# Altium footprint library Blue Tractor-2021.PcbLib: 82 footprints (part 4 of 6)
Each footprint in its own frame and in the unit in brackets; x right, y up, seen from the top. Pads: shape width x height; smd on the part's side, far side on the other; paste and mask are expansions set on the pad; w line width, h text height; cw(c..) or ccw(c..) is an arc to the next point about the centre after c.
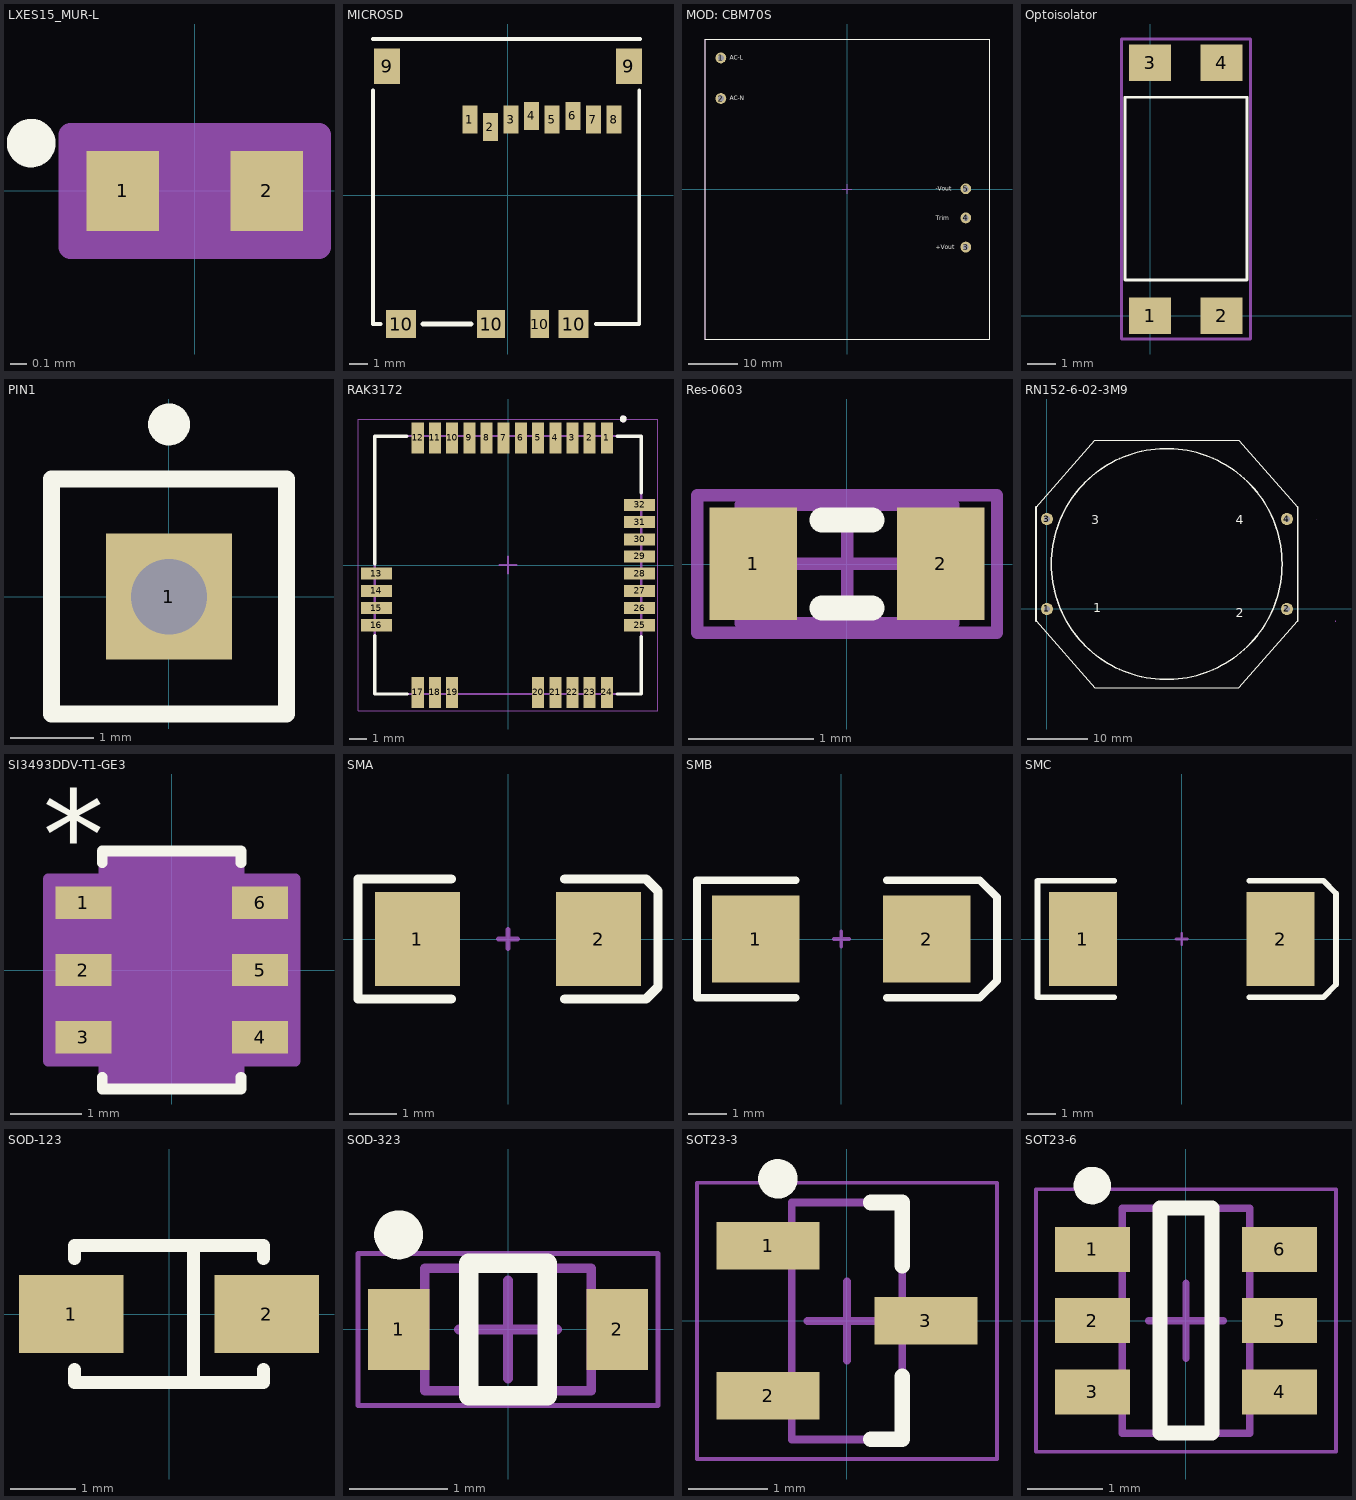
[diagram p3: the footprints below, top view; thin cyan lines are the x and y axes]

## LXES15_MUR-L [mm] "TVS"
pads (2):
  rect 0.452x0.499 smd paste+0 mask+0: 1(-0.451,0) 2(0.451,0)
Top Overlay:
  circle w0.152: c-1.025,0.3 r0.076
Mechanical 13:
  circle w0: c-0.324,0 r0.076
  lines w0.025: -0.525,-0.275 -0.525,0.275 ; -0.525,-0.275 0.525,-0.275 ; -0.525,-0.275 -0.225,-0.275 -0.225,0.275 -0.525,0.275 ; -0.525,-0.275 -0.525,0.275 ; -0.525,0.275 0.525,0.275 ; 0.525,-0.275 0.525,0.275 ; 0.525,-0.275 0.525,0.275 ; 0.525,-0.275 0.225,-0.275 0.225,0.275 0.525,0.275
Mechanical 15:
  region: 0.779,-0.351 -0.779,-0.351 -0.779,0.351 0.779,0.351
  lines w0.152: -0.779,-0.351 0.779,-0.351 0.779,0.351 -0.779,0.351 -0.779,-0.351
3D body "LXES15_MUR.step": height 0.33, standoff 0, extent -0.525,-0.275 0.525,0.275

## MICROSD [mm]
height 1.8
pads (14):
  rect 0.8x1.5 smd: 1(-2.04,4.025) 2(-0.94,3.625) 3(0.16,4.025) 4(1.26,4.225) 5(2.36,4.025) 6(3.46,4.225) 7(4.56,4.025) 8(5.66,4.025)
  rect 1.4x1.9 smd: 9(-6.45,6.875) 9(6.45,6.875)
  rect 1.6x1.5 smd: 10(-5.7,-6.875) 10(3.5,-6.875)
  rect 1.5x1.5 smd: 10(-0.9,-6.875)
  rect 1x1.5 smd: 10(1.7,-6.875)
Top Overlay:
  lines w0.2: -7.2,5.575 -7.2,-6.875 -6.8,-6.875 ; -7.2,8.325 7.05,8.325 ; 4.675,-6.875 7,-6.875 7,5.575
  lines w0.254: -4.55,-6.875 -1.975,-6.875
3D body "User Library-MEM2050.step": height 1.9, standoff 0, extent -7.2,-6.875 7.05,8.325

## MOD: CBM70S [mm] "AC/DC CONVERTER"
height 17
pads (5):
  round 2.2 hole 1.2: 1(-25.65,26.66) 2(-25.65,18.4) 3(24.15,-11.8) 4(24.15,-5.88) 5(24.15,0.04)
Top Overlay:
  lines w0.2: -28.9,-30.5 -28.9,30.5 28.9,30.5 28.9,-30.5 -28.9,-30.5
  text "+Vout" at 18,-12.24 h0.9
  text "Trim" at 18,-6.32 h0.9
  text "-Vout" at 18,-0.4 h0.9
  text "AC-N" at -23.8,18.04 h0.9
  text "AC-L" at -23.8,26.3 h0.9
Mechanical 13:
  lines w0.1: -28.9,-30.5 28.9,-30.5 28.9,30.5 -28.9,30.5 -28.9,-30.5
Mechanical 15:
  lines w0.1: -1,0 1,0 ; 0,-1 0,1 ; -28.9,-30.5 28.9,-30.5 28.9,30.5 -28.9,30.5 -28.9,-30.5
3D body "User Library-CBM70S.STEP": height 17, standoff -6.6, extent -28.95,-30.5 28.95,30.5

## Optoisolator [mm] "TV-817S"
pads (4):
  rect 1.5x1.3 smd: 1(0,0) 2(2.54,0) 3(0,9) 4(2.54,9)
Top Overlay:
  lines w0.1: 3.425,1.275 -0.9,1.275 -0.9,7.775 3.45,7.775 3.45,1.275
Mechanical 15:
  lines w0.1: -1.025,-0.825 -1.025,9.85 3.575,9.85 3.575,-0.825 -1.025,-0.825

## PIN1 [mm] "Connector; Plug"
pads (1):
  rect 1.5x1.5 hole 0.9: 1(0,0)
Top Overlay:
  circle w0.25: c0,2.05 r0.125
  lines w0.2: -1.4,-1.4 -1.4,1.4 1.4,1.4 1.4,-1.4 -1.4,-1.4

## RAK3172 [mm] "SMD RF MODULE"
height 3.5
pads (32):
  rect 0.7x1.8 smd: 1(5.75,7.4) 2(4.75,7.4) 3(3.75,7.4) 4(2.75,7.4) 5(1.75,7.4) 6(0.75,7.4) 7(-0.25,7.4) 8(-1.25,7.4) 9(-2.25,7.4) 10(-3.25,7.4) 11(-4.25,7.4) 12(-5.25,7.4) 17(-5.25,-7.4) 18(-4.25,-7.4) 19(-3.25,-7.4) 20(1.75,-7.4) 21(2.75,-7.4) 22(3.75,-7.4) 23(4.75,-7.4) 24(5.75,-7.4)
  rect 1.8x0.7 smd: 13(-7.65,-0.5) 14(-7.65,-1.5) 15(-7.65,-2.5) 16(-7.65,-3.5) 25(7.65,-3.5) 26(7.65,-2.5) 27(7.65,-1.5) 28(7.65,-0.5) 29(7.65,0.5) 30(7.65,1.5) 31(7.65,2.5) 32(7.65,3.5)
Top Overlay:
  circle w0.2: c6.7,8.5 r0.1
  lines w0.2: -7.75,-4.1 -7.75,-7.5 -5.85,-7.5 ; -7.75,0.075 -7.75,7.5 -5.9,7.5 ; 6.35,-7.5 7.75,-7.5 7.75,-4.175 ; 6.35,7.5 7.75,7.5 7.75,4.2
Mechanical 13:
  circle w0.2: c6.7,8.5 r0.1
  lines w0.127: -7.75,-7.5 7.75,-7.5 7.75,7.5 -7.75,7.5 -7.75,-7.5
Mechanical 15:
  lines w0.05: -8.725,-8.475 8.725,-8.475 8.725,8.475 -8.725,8.475 -8.725,-8.475
  lines w0.1: -0.5,0 0.5,0 ; 0,-0.5 0,0.5
3D body "3D_RAK3172.stp": height 3.5, standoff -0.01, extent -7.75,-7.5 7.75,7.5

## Res-0603 [mm] "Chip Resistor, Body 1.6x0.8mm, IPC High Density"
height 0.9
pads (2):
  rect 0.7x0.9 smd: 1(-0.75,0) 2(0.75,0)
Top Overlay:
  lines w0.2: -0.2,-0.35 0.2,-0.35 ; -0.2,0.35 0.2,0.35
Mechanical 13:
  lines w0.1: -0.85,-0.475 -0.85,0.475 0.85,0.475 0.85,-0.475 -0.85,-0.475
Mechanical 15:
  lines w0.1: -0.475,0 0.475,0 ; 0,-0.475 0,0.475 ; -1.2,-0.55 -1.2,0.55 1.2,0.55 1.2,-0.55 -1.2,-0.55
3D body "User Library-Panasonic0603.step": height 0.45, standoff 0, extent -0.8,-0.41 0.8,0.41

## RN152-6-02-3M9 [mm] "INDUCTOR SINF"
pads (4):
  round 2 hole 1: 1(0,0) 2(40,0) 3(0,15) 4(40,15)
Top Overlay:
  circle w0.254: c19.95,7.5 r19.235
  lines w0.2: -1.825,-2 8,-13.1 32,-13.1 41.825,-2 ; -1.825,17 8,28.1 32,28.1 41.825,17
  lines w0.254: -1.825,-2 -1.825,17 ; 41.825,-2 41.825,17
  text "1" at 7.675,-0.525 h1.52
  text "2" at 31.475,-1.35 h1.52
  text "3" at 7.35,14.1 h1.52
  text "4" at 31.475,14.1 h1.52
Mechanical 11:
  lines w0.1: 44.85,14.925 44.85,15 ; 48.175,-2.1 48.175,-1.95

## SI3493DDV-T1-GE3 [mil] "N Channel transistor 6TSOP_VIS-L"
pads (6):
  rect 31x18 smd paste+0 mask+0: 1(-49,37.4) 2(-49,0) 3(-49,-37.4) 4(49,-37.4) 5(49,0) 6(49,37.4)
Top Overlay:
  lines w6: -38.5,-59.5 -38.5,-66 38.5,-66 38.5,-59.5 ; -38.5,59.5 -38.5,66 38.5,66 38.5,59.5
  text "*" at -71.5,50.4 h50
Mechanical 13:
  lines w0: -12,61 ccw(c0,61) 12,61
  lines w1: -58.5,-46.4 -58.5,-28.4 -33.5,-28.4 -33.5,-46.4 -58.5,-46.4 ; -58.5,-9 -58.5,9 -33.5,9 -33.5,-9 -58.5,-9 ; -58.5,28.4 -58.5,46.4 -33.5,46.4 -33.5,28.4 -58.5,28.4 ; -33.5,-61 33.5,-61 33.5,61 -33.5,61 -33.5,-61 ; 33.5,-46.4 33.5,-28.4 58.5,-28.4 58.5,-46.4 33.5,-46.4 ; 33.5,-9 33.5,9 58.5,9 58.5,-9 33.5,-9 ; 33.5,28.4 33.5,46.4 58.5,46.4 58.5,28.4 33.5,28.4
  text "*" at -31,8 h50
Mechanical 15:
  region: -37.5,-50.4 -68.5,-50.4 -68.5,50.4 -37.5,50.4 -37.5,65 37.5,65 37.5,50.4 68.5,50.4 68.5,-50.4 37.5,-50.4 37.5,-65 -37.5,-65
  lines w6: -68.5,-50.4 -68.5,50.4 -37.5,50.4 -37.5,65 37.5,65 37.5,50.4 68.5,50.4 68.5,-50.4 37.5,-50.4 37.5,-65 -37.5,-65 -37.5,-50.4 -68.5,-50.4
3D body "6TSOP_VIS.step": height 43.11, standoff 0, extent -58.5,-60.98 58.5,60.98

## SMA [mm] "DO-214-AC/SMA; 2 C-Bend Leads; Body 4.5 x 2.5 mm, inc. leads (LxW)"
height 2.4
pads (2):
  rect 1.8x2 smd: 1(-1.92,0) 2(1.92,0)
Top Overlay:
  lines w0.2: -1.2,-1.27 -3.175,-1.27 -3.175,1.27 -1.2,1.27 ; 1.2,-1.27 2.921,-1.27 3.175,-1.016 3.175,1.016 2.921,1.27 1.2,1.27
Mechanical 1:
  lines w0.1: -0.2,0 0.2,0 ; 0,-0.2 0,0.2
3D body "DO-214AC SMA.step": height 2.6, standoff 0.03, extent -2.75,-1.4 2.75,1.4

## SMB [mm] "DO-214-AA/SMB; 2 C-Bend Leads; Body 5.3 x 3.6 mm, inc. leads (LxW)"
height 2.54
pads (2):
  rect 2.3x2.3 smd: 1(-2.25,0) 2(2.25,0)
Top Overlay:
  lines w0.2: -1.2,-1.55 -3.8,-1.55 -3.8,1.55 -1.2,1.55 ; 1.2,-1.55 3.65,-1.55 4.1,-1.1 4.1,1.1 3.65,1.55 1.2,1.55
Mechanical 1:
  lines w0.1: -0.2,0 0.2,0 ; 0,-0.2 0,0.2
3D body "SMB.step": height 2.45, standoff 0.03, extent -2.75,-1.95 2.75,1.95

## SMC [mm] "DO-214-AB/SMC; 2 C-Bend Leads; Body 7.9 x 5.9 mm, inc. leads (LxW)"
height 2.65
pads (2):
  rect 2.4x3.3 smd: 1(-3.475,0) 2(3.475,0)
Top Overlay:
  lines w0.2: -2.375,-2.05 -5.075,-2.05 -5.075,2.05 -2.375,2.05 ; 2.375,-2.05 4.975,-2.05 5.425,-1.6 5.425,1.6 4.975,2.055 ; 2.375,2.05 4.975,2.05
Mechanical 1:
  lines w0.1: -0.2,0 0.2,0 ; 0,-0.2 0,0.2
3D body "SMC.step": height 2.4, standoff 0.03, extent -4.065,-3.05 4.065,3.05

## SOD-123 [mm] "SOD-123; 2 Leads; Body 2.7 x 1.6 mm, (LxW)"
height 1.35
pads (2):
  rect 1.6x1.2 smd: 1(-1.5,0) 2(1.5,0)
Top Overlay:
  lines w0.2: -1.45,-0.85 -1.45,-1.05 1.45,-1.05 1.45,-0.85 ; -1.45,0.85 -1.45,1.05 1.45,1.05 1.45,0.85 ; 0.373,-1.05 0.373,1.05
3D body "SOD-123.STEP": height 1.45, standoff 0, extent -1.925,-0.85 1.925,0.85

## SOD-323 [mm] "SOD, 2-Leads, Body 1.7x1.25mm"
height 1.062
pads (2):
  rect 0.63x0.83 smd: 1(-1.115,0) 2(1.115,0)
Top Overlay:
  circle w0.25: c-1.115,0.965 r0.125
  lines w0.2: -0.4,-0.675 -0.4,0.675 0.4,0.675 0.4,-0.675 -0.4,-0.675
Mechanical 13:
  lines w0.1: -0.85,-0.625 -0.85,0.625 0.85,0.625 0.85,-0.625 -0.85,-0.625
Mechanical 15:
  lines w0.05: -1.53,-0.775 -1.53,0.775 1.53,0.775 1.53,-0.775 -1.53,-0.775
  lines w0.1: -0.5,0 0.5,0 ; 0,-0.5 0,0.5
3D body: height 1.06, standoff 0, extent -0.85,-0.625 0.85,0.625

## SOT23-3 [mm] "SOT23, 3-Leads, Body 2,90x2,30mm, Pitch 0,95mm, IPC Medium Density"
height 1.1
pads (3):
  rect 1.3x0.6 smd: 1(-1,0.95) 2(-1,-0.95) 3(1,0)
Top Overlay:
  circle w0.25: c-0.875,1.8 r0.125
  lines w0.2: 0.3,-1.5 0.7,-1.5 0.7,-0.7 ; 0.3,1.5 0.7,1.5 0.7,0.7
Mechanical 13:
  lines w0.1: -0.7,-1.5 0.7,-1.5 0.7,1.5 -0.7,1.5 -0.7,-1.5
Mechanical 15:
  lines w0.05: -1.9,-1.75 1.9,-1.75 1.9,1.75 -1.9,1.75 -1.9,-1.75
  lines w0.1: -0.5,0 0.5,0 ; 0,-0.5 0,0.5
3D body "SOT23-3.step": height 1.3, standoff 0, extent -1.4,-1.45 1.4,1.45

## SOT23-6 [mm]
pads (6):
  rect 1x0.6 smd: 1(-1.25,0.95) 2(-1.25,0) 3(-1.25,-0.95) 4(1.25,-0.95) 5(1.25,0) 6(1.25,0.95)
Top Overlay:
  circle w0.25: c-1.25,1.8 r0.125
  lines w0.2: -0.35,-1.5 0.35,-1.5 0.35,1.5 -0.35,1.5 -0.35,-1.5
Mechanical 13:
  lines w0.1: -0.85,-1.5 -0.85,1.5 0.85,1.5 0.85,-1.5 -0.85,-1.5
Mechanical 15:
  lines w0.05: -2,-1.75 -2,1.75 2,1.75 2,-1.75 -2,-1.75
  lines w0.1: -0.5,0 0.5,0 ; 0,-0.5 0,0.5
3D body "User Library-SOT23-6-2.step": height 1.45, standoff 0, extent -1.4,-1.45 1.4,1.45